# Altium footprint library rcl.PCBLIB: 513 footprints (part 14 of 33)
Each footprint in its own frame and in the unit in brackets; x right, y up, seen from the top. Pads: shape width x height; smd on the part's side, far side on the other; paste and mask are expansions set on the pad; w line width, h text height; cw(c..) or ccw(c..) is an arc to the next point about the centre after c.
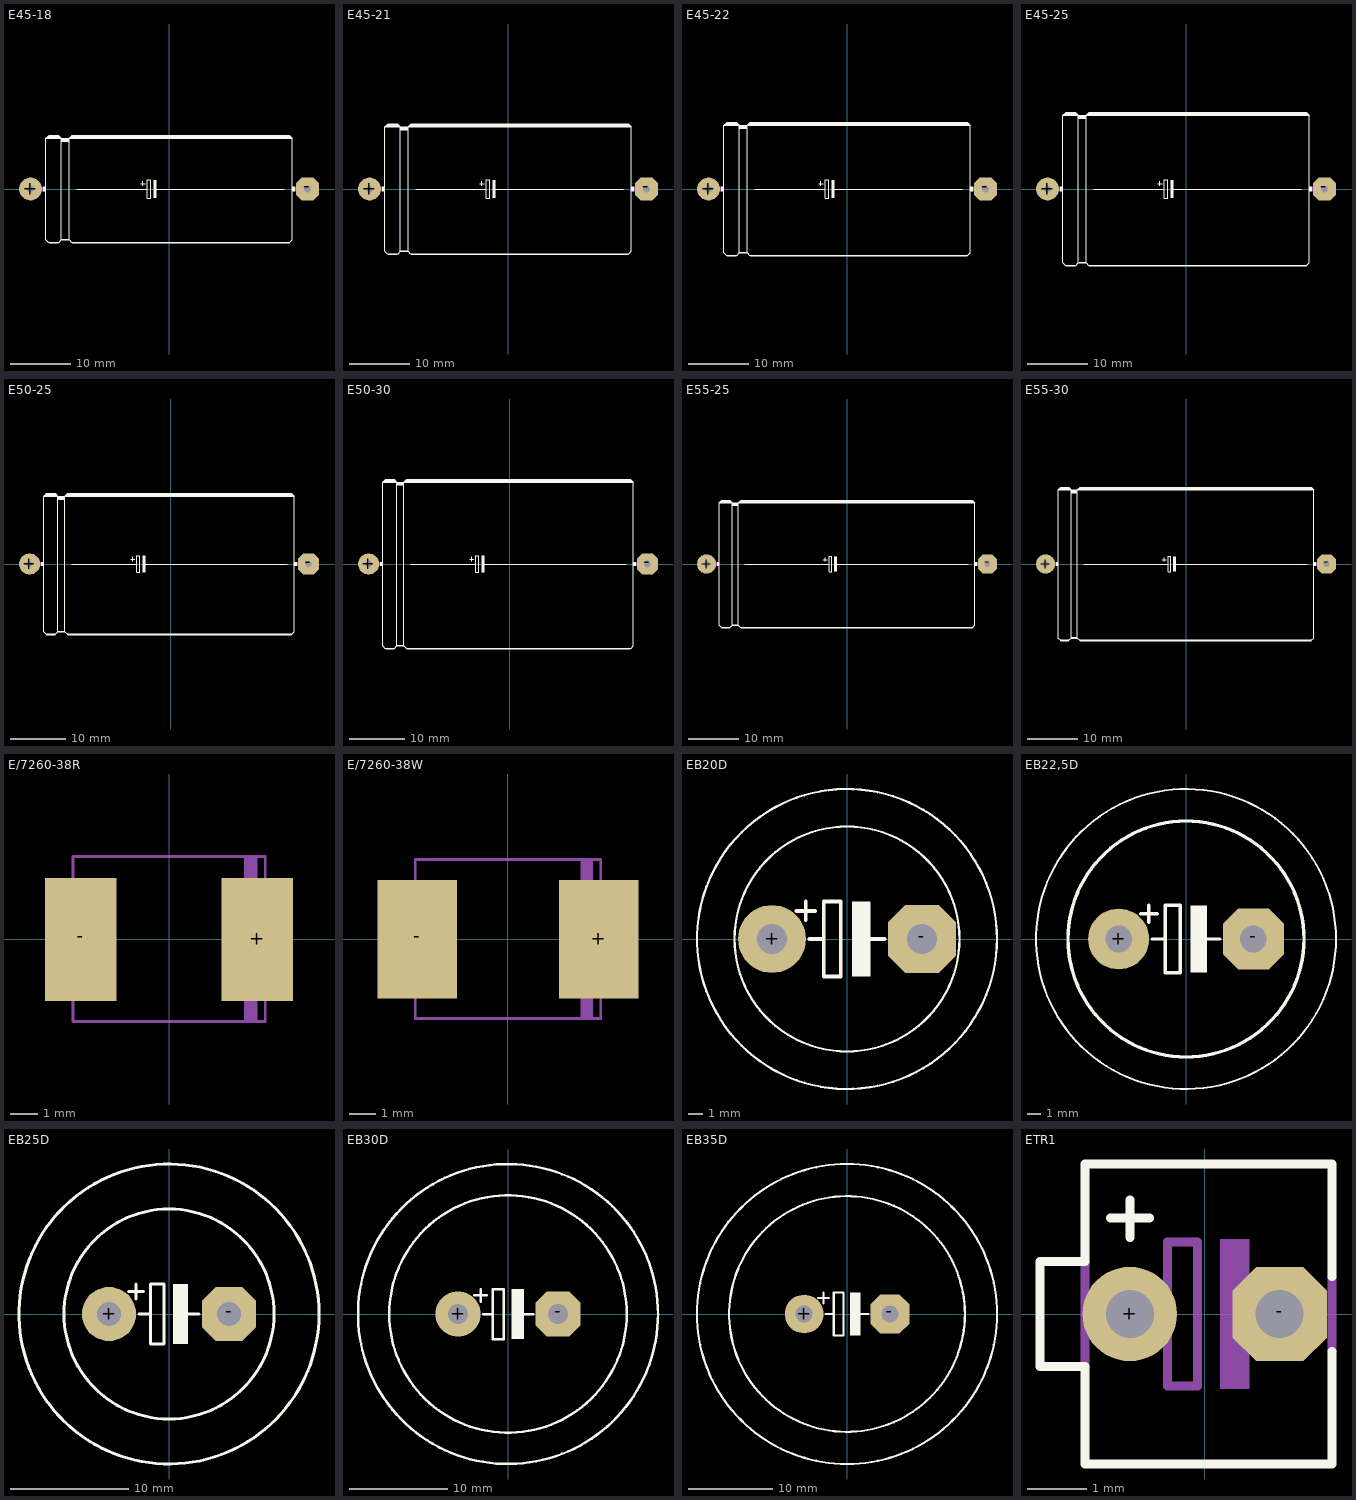
[diagram p13: the footprints below, top view; thin cyan lines are the x and y axes]

## E45-18 [mil]
pads (2):
  round 150 hole 44: +(-900,0)
  oct 150x150 hole 44: -(900,0)
Top Overlay:
  rectangle: -820,-15 -800,15
  rectangle: 800,-15 820,15
  rectangle: -100,-60 -80,60
  lines w6: -720,-348 -780,-348 -780,-350 ; -600,0 -140,0 ; -185,35 -155,35 ; -170,20 -170,50 ; -85,0 750,0 ; 780,-348 -630,-348 -630,-350 ; -800,330 -700,330 ; -800,330 -800,-330 -785,-345 ; -800,330 -780,350 -720,350 -700,330 ; -785,-345 -780,-350 ; -785,-345 -715,-345 ; -780,-350 -720,-350 -715,-345 ; -715,-345 -700,-330 ; -700,-330 -700,-328 ; -700,-330 -650,-330 ; -700,-328 -700,-325 ; -700,-328 -650,-328 ; -700,-325 -700,310 ; -700,-325 -650,-325 ; -700,310 -650,310 ; -700,310 -700,330 ; -700,330 -650,330 ; -650,-330 -635,-345 ; -650,-330 -650,-328 ; -650,-328 -650,-325 ; -650,-325 -650,310 ; -650,310 -650,330 ; -650,330 800,330 ; -650,330 -630,350 780,350 800,330 ; -635,-345 785,-345 ; -635,-345 -630,-350 ; -630,-350 780,-350 785,-345 ; -140,0 -140,-60 -120,-60 -120,60 -140,60 -140,0 ; 785,-345 800,-330 800,330
  lines w12: -790,335 -710,335 ; -780,345 -720,345 ; -695,315 -655,315 ; -695,325 -655,325 ; -640,335 790,335 ; -630,345 780,345
Mechanical 4:
  lines w30: -900,0 -825,0 ; 825,0 900,0

## E45-21 [mil]
pads (2):
  round 150 hole 44: +(-900,0)
  oct 150x150 hole 44: -(900,0)
Top Overlay:
  rectangle: -820,-15 -800,15
  rectangle: 800,-15 820,15
  rectangle: -100,-60 -80,60
  lines w6: -720,-423 -780,-423 -780,-425 ; -600,0 -140,0 ; -185,35 -155,35 ; -170,20 -170,50 ; -85,0 750,0 ; 780,-423 -630,-423 -630,-425 ; -800,405 -700,405 ; -800,405 -800,-405 -785,-420 ; -800,405 -780,425 -720,425 -700,405 ; -785,-420 -780,-425 ; -785,-420 -715,-420 ; -780,-425 -720,-425 -715,-420 ; -715,-420 -700,-405 ; -700,-405 -700,-403 ; -700,-405 -650,-405 ; -700,-403 -700,-400 ; -700,-403 -650,-403 ; -700,-400 -700,385 ; -700,-400 -650,-400 ; -700,385 -650,385 ; -700,385 -700,405 ; -700,405 -650,405 ; -650,-405 -635,-420 ; -650,-405 -650,-403 ; -650,-403 -650,-400 ; -650,-400 -650,385 ; -650,385 -650,405 ; -650,405 800,405 ; -650,405 -630,425 780,425 800,405 ; -635,-420 785,-420 ; -635,-420 -630,-425 ; -630,-425 780,-425 785,-420 ; -140,0 -140,-60 -120,-60 -120,60 -140,60 -140,0 ; 785,-420 800,-405 800,405
  lines w12: -790,410 -710,410 ; -780,420 -720,420 ; -695,390 -655,390 ; -695,400 -655,400 ; -640,410 790,410 ; -630,420 780,420
Mechanical 4:
  lines w30: -900,0 -825,0 ; 825,0 900,0

## E45-22 [mil]
pads (2):
  round 150 hole 44: +(-900,0)
  oct 150x150 hole 44: -(900,0)
Top Overlay:
  rectangle: -820,-15 -800,15
  rectangle: 800,-15 820,15
  rectangle: -100,-60 -80,60
  lines w6: -720,-433 -780,-433 -780,-435 ; -600,0 -140,0 ; -185,35 -155,35 ; -170,20 -170,50 ; -85,0 750,0 ; 780,-433 -630,-433 -630,-435 ; -800,415 -700,415 ; -800,415 -800,-415 -785,-430 ; -800,415 -780,435 -720,435 -700,415 ; -785,-430 -780,-435 ; -785,-430 -715,-430 ; -780,-435 -720,-435 -715,-430 ; -715,-430 -700,-415 ; -700,-415 -700,-413 ; -700,-415 -650,-415 ; -700,-413 -700,-410 ; -700,-413 -650,-413 ; -700,-410 -700,395 ; -700,-410 -650,-410 ; -700,395 -650,395 ; -700,395 -700,415 ; -700,415 -650,415 ; -650,-415 -635,-430 ; -650,-415 -650,-413 ; -650,-413 -650,-410 ; -650,-410 -650,395 ; -650,395 -650,415 ; -650,415 800,415 ; -650,415 -630,435 780,435 800,415 ; -635,-430 785,-430 ; -635,-430 -630,-435 ; -630,-435 780,-435 785,-430 ; -140,0 -140,-60 -120,-60 -120,60 -140,60 -140,0 ; 785,-430 800,-415 800,415
  lines w12: -790,420 -710,420 ; -780,430 -720,430 ; -695,400 -655,400 ; -695,410 -655,410 ; -640,420 790,420 ; -630,430 780,430
Mechanical 4:
  lines w30: -900,0 -825,0 ; 825,0 900,0

## E45-25 [mil]
pads (2):
  round 150 hole 44: +(-900,0)
  oct 150x150 hole 44: -(900,0)
Top Overlay:
  rectangle: -820,-15 -800,15
  rectangle: 800,-15 820,15
  rectangle: -100,-60 -80,60
  lines w6: -720,-498 -780,-498 -780,-500 ; -600,0 -140,0 ; -185,35 -155,35 ; -170,20 -170,50 ; -85,0 750,0 ; 780,-498 -630,-498 -630,-500 ; -800,480 -700,480 ; -800,480 -800,-480 -785,-495 ; -800,480 -780,500 -720,500 -700,480 ; -785,-495 -780,-500 ; -785,-495 -715,-495 ; -780,-500 -720,-500 -715,-495 ; -715,-495 -700,-480 ; -700,-480 -700,-478 ; -700,-480 -650,-480 ; -700,-478 -700,-475 ; -700,-478 -650,-478 ; -700,-475 -700,460 ; -700,-475 -650,-475 ; -700,460 -650,460 ; -700,460 -700,480 ; -700,480 -650,480 ; -650,-480 -635,-495 ; -650,-480 -650,-478 ; -650,-478 -650,-475 ; -650,-475 -650,460 ; -650,460 -650,480 ; -650,480 800,480 ; -650,480 -630,500 780,500 800,480 ; -635,-495 785,-495 ; -635,-495 -630,-500 ; -630,-500 780,-500 785,-495 ; -140,0 -140,-60 -120,-60 -120,60 -140,60 -140,0 ; 785,-495 800,-480 800,480
  lines w12: -790,485 -710,485 ; -780,495 -720,495 ; -695,465 -655,465 ; -695,475 -655,475 ; -640,485 790,485 ; -630,495 780,495
Mechanical 4:
  lines w30: -900,0 -825,0 ; 825,0 900,0

## E50-25 [mil]
pads (2):
  round 150 hole 44: +(-1000,0)
  oct 150x150 hole 44: -(975,0)
Top Overlay:
  rectangle: -920,-15 -900,15
  rectangle: 875,-15 895,15
  rectangle: -200,-60 -180,60
  lines w6: -820,-498 -880,-498 -880,-500 ; -700,0 -240,0 ; -285,35 -255,35 ; -270,20 -270,50 ; -185,0 825,0 ; 855,-498 -730,-498 -730,-500 ; -900,480 -800,480 ; -900,480 -900,-480 -885,-495 ; -900,480 -880,500 -820,500 -800,480 ; -885,-495 -880,-500 ; -885,-495 -815,-495 ; -880,-500 -820,-500 -815,-495 ; -815,-495 -800,-480 ; -800,-480 -800,-478 ; -800,-480 -750,-480 ; -800,-478 -750,-478 ; -800,-478 -800,-475 ; -800,-475 -750,-475 ; -800,-475 -800,460 ; -800,460 -750,460 ; -800,460 -800,480 ; -800,480 -750,480 ; -750,-480 -750,-478 ; -750,-480 -735,-495 ; -750,-478 -750,-475 ; -750,-475 -750,460 ; -750,460 -750,480 ; -750,480 875,480 ; -750,480 -730,500 855,500 875,480 ; -735,-495 -730,-500 ; -735,-495 860,-495 ; -730,-500 855,-500 860,-495 ; -240,0 -240,-60 -220,-60 -220,60 -240,60 -240,0 ; 860,-495 875,-480 875,480
  lines w12: -890,485 -885,485 ; -885,490 -885,485 ; -880,495 -820,495 ; -815,490 -815,485 ; -810,485 -815,485 ; -795,465 -755,465 ; -795,475 -755,475 ; -740,485 -735,485 ; -735,490 -735,485 ; -730,495 855,495 ; 865,485 -735,485 ; -885,485 -815,485
Mechanical 4:
  lines w30: -1000,0 -925,0 ; 900,0 975,0

## E50-30 [mil]
pads (2):
  round 150 hole 47: +(-1000,0)
  oct 150x150 hole 47: -(975,0)
Top Overlay:
  rectangle: -920,-15 -900,15
  rectangle: 875,-15 895,15
  rectangle: -200,-60 -180,60
  lines w6: -820,-598 -880,-598 -880,-600 ; -700,0 -240,0 ; -285,35 -255,35 ; -270,20 -270,50 ; -185,0 825,0 ; 855,-598 -730,-598 -730,-600 ; -900,580 -800,580 ; -900,580 -900,-580 -885,-595 ; -900,580 -880,600 -820,600 -800,580 ; -885,-595 -880,-600 ; -885,-595 -815,-595 ; -880,-600 -820,-600 -815,-595 ; -815,-595 -800,-580 ; -800,-580 -800,-578 ; -800,-580 -750,-580 ; -800,-578 -750,-578 ; -800,-578 -800,-575 ; -800,-575 -750,-575 ; -800,-575 -800,560 ; -800,560 -750,560 ; -800,560 -800,580 ; -800,580 -750,580 ; -750,-580 -750,-578 ; -750,-580 -735,-595 ; -750,-578 -750,-575 ; -750,-575 -750,560 ; -750,560 -750,580 ; -750,580 875,580 ; -750,580 -730,600 855,600 875,580 ; -735,-595 -730,-600 ; -735,-595 860,-595 ; -730,-600 855,-600 860,-595 ; -240,0 -240,-60 -220,-60 -220,60 -240,60 -240,0 ; 860,-595 875,-580 875,580
  lines w12: -890,585 -885,585 ; -885,590 -885,585 ; -880,595 -820,595 ; -815,590 -815,585 ; -810,585 -815,585 ; -795,565 -755,565 ; -795,575 -755,575 ; -740,585 -735,585 ; -735,590 -735,585 ; -730,595 855,595 ; 865,585 -735,585 ; -885,585 -815,585
Mechanical 4:
  lines w30: -1000,0 -925,0 ; 900,0 975,0

## E55-25 [mil]
pads (2):
  round 150 hole 44: +(-1100,0)
  oct 150x150 hole 44: -(1100,0)
Top Overlay:
  rectangle: -100,-60 -80,60
  rectangle: 1000,-15 1020,15
  rectangle: -1020,-15 -1000,15
  lines w6: -920,-498 -980,-498 -980,-500 ; -800,0 -140,0 ; -185,35 -155,35 ; -170,20 -170,50 ; -85,0 950,0 ; 980,-498 -830,-498 -830,-500 ; -1000,480 -980,500 -920,500 -900,480 ; -1000,480 -1000,-480 -985,-495 ; -1000,480 -900,480 ; -985,-495 -915,-495 ; -985,-495 -980,-500 ; -980,-500 -920,-500 -915,-495 ; -915,-495 -900,-480 ; -900,-480 -850,-480 ; -900,-480 -900,-478 ; -900,-478 -850,-478 ; -900,-478 -900,-475 ; -900,-475 -850,-475 ; -900,-475 -900,460 ; -900,460 -900,480 ; -900,460 -850,460 ; -900,480 -850,480 ; -850,-480 -850,-478 ; -850,-480 -835,-495 ; -850,-478 -850,-475 ; -850,-475 -850,460 ; -850,460 -850,480 ; -850,480 -830,500 980,500 1000,480 ; -850,480 1000,480 ; -835,-495 -830,-500 ; -835,-495 985,-495 ; -830,-500 980,-500 985,-495 ; -140,0 -140,60 -120,60 -120,-60 -140,-60 -140,0 ; 985,-495 1000,-480 1000,480
  lines w12: -990,485 -910,485 ; -980,495 -920,495 ; -895,465 -855,465 ; -895,475 -855,475 ; -840,485 990,485 ; -830,495 980,495
Mechanical 4:
  lines w30: -1100,0 -1025,0 ; 1025,0 1100,0

## E55-30 [mil]
pads (2):
  round 150 hole 47: +(-1100,0)
  oct 150x150 hole 47: -(1100,0)
Top Overlay:
  rectangle: -1020,-15 -1000,15
  rectangle: 1000,-15 1020,15
  rectangle: -100,-60 -80,60
  lines w6: -920,-598 -980,-598 -980,-600 ; -800,0 -140,0 ; -185,35 -155,35 ; -170,20 -170,50 ; -85,0 950,0 ; 980,-598 -830,-598 -830,-600 ; -1000,580 -900,580 ; -1000,580 -1000,-580 -985,-595 ; -1000,580 -980,600 -920,600 -900,580 ; -985,-595 -980,-600 ; -985,-595 -915,-595 ; -980,-600 -920,-600 -915,-595 ; -915,-595 -900,-580 ; -900,-580 -900,-578 ; -900,-580 -850,-580 ; -900,-578 -900,-575 ; -900,-578 -850,-578 ; -900,-575 -900,560 ; -900,-575 -850,-575 ; -900,560 -850,560 ; -900,560 -900,580 ; -900,580 -850,580 ; -850,-580 -835,-595 ; -850,-580 -850,-578 ; -850,-578 -850,-575 ; -850,-575 -850,560 ; -850,560 -850,580 ; -850,580 1000,580 ; -850,580 -830,600 980,600 1000,580 ; -835,-595 985,-595 ; -835,-595 -830,-600 ; -830,-600 980,-600 985,-595 ; -140,0 -140,-60 -120,-60 -120,60 -140,60 -140,0 ; 985,-595 1000,-580 1000,580
  lines w12: -990,585 -910,585 ; -980,595 -920,595 ; -895,565 -855,565 ; -895,575 -855,575 ; -840,585 990,585 ; -830,595 980,595
Mechanical 4:
  lines w30: -1100,0 -1025,0 ; 1025,0 1100,0

## E/7260-38R [mil]
pads (2):
  rect 101x174 smd: +(125,0) -(-125,0)
Mechanical 4:
  rectangle: 106,-117.13 125,118
  rectangle: 138,-80.71 144,81
  rectangle: -143.7,-80.71 -137.8,81
  lines w4: -135.83,-116.14 -135.83,117 136,117 136,-116.14 -135.83,-116.14

## E/7260-38W [mil]
pads (2):
  rect 117x174 smd: +(133,0) -(-132.87,0)
Mechanical 4:
  rectangle: -143.7,-80.71 -137.8,81
  rectangle: 138,-80.71 144,81
  rectangle: 106,-117.13 125,118
  lines w4: -135.83,-116.14 136,-116.14 136,117 -135.83,117 -135.83,-116.14

## EB20D [mil]
pads (2):
  round 181 hole 79: +(-200,0)
  oct 181x181 hole 79: -(200,0)
Top Overlay:
  circle w6: c0,0 r400
  circle w6: c0,0 r300
  rectangle: 13,-100 63,100
  lines w10: -135,75 -85,75 ; -110,50 -110,100 ; -100,0 -62,0 ; 25,0 100,0 ; -62,0 -62,100 -17,100 -17,-100 -62,-100 -62,0

## EB22,5D [mil]
pads (2):
  round 181 hole 79: +(-200,0)
  oct 181x181 hole 79: -(200,0)
Top Overlay:
  circle w10: c0,0 r350
  circle w6: c0,0 r445
  rectangle: 13,-100 63,100
  lines w10: -135,75 -85,75 ; -110,50 -110,100 ; -100,0 -62,0 ; 25,0 100,0 ; -62,0 -62,100 -17,100 -17,-100 -62,-100 -62,0

## EB25D [mil]
pads (2):
  round 181 hole 79: +(-200,0)
  oct 181x181 hole 79: -(200,0)
Top Overlay:
  circle w10: c0,0 r500
  circle w10: c0,0 r350
  rectangle: 13,-100 63,100
  lines w10: -135,75 -85,75 ; -110,50 -110,100 ; -100,0 -62,0 ; 25,0 100,0 ; -62,0 -62,100 -17,100 -17,-100 -62,-100 -62,0

## EB30D [mil]
pads (2):
  round 181 hole 79: +(-200,0)
  oct 181x181 hole 79: -(200,0)
Top Overlay:
  circle w10: c0,0 r475
  circle w10: c0,0 r600
  rectangle: 13,-100 63,100
  lines w10: -135,75 -85,75 ; -110,50 -110,100 ; -100,0 -62,0 ; 25,0 100,0 ; -62,0 -62,-100 -17,-100 -17,100 -62,100 -62,0

## EB35D [mil]
pads (2):
  round 181 hole 79: +(-200,0)
  oct 181x181 hole 79: -(200,0)
Top Overlay:
  circle w10: c0,0 r700
  circle w10: c0,0 r550
  rectangle: 13,-100 63,100
  lines w10: -135,75 -85,75 ; -110,50 -110,100 ; -100,0 -62,0 ; 55,0 100,0 ; -62,0 -62,100 -17,100 -17,-100 -62,-100 -62,0

## ETR1 [mil]
pads (2):
  round 63 hole 32: +(-50,0)
  oct 63x63 hole 32: -(50,0)
Top Overlay:
  lines w6: -63,64 -37,64 ; -50,51 -50,76 ; 85,-25 85,-100 -80,-100 -80,-35 -110,-35 -110,35 -80,35 -80,100 85,100 85,25
Mechanical 4:
  rectangle: 10,-50 30,50
  lines w6: -80,-35 -80,35 ; -65,0 -25,0 ; 25,0 65,0 ; 85,-25 85,25 ; -25,0 -25,-48 -5,-48 -5,48 -25,48 -25,0